# Altium schematic symbol library Minh_Lib.SchLib: 619 symbols (part 2 of 4) (continued)
## EEE-0JA331P
designator EEE?  Supplier Part Number 1: 667-EEE-0JA331P
Aluminum Electrolytic Capacitor, 330UF, 6.3V, 20%, SMD, Full Reel; Manufacturer: Panasonic; Manufacturer Part Number: EEE-0JA331P; Ripple Current (AC): 300mA; Leakage Current: 3uA; Life (Hours): 2000Hour; Dissipation Factor: 0.35%; Supplier 1: Mouser; RoHS: Yes; Category: Aluminum Electrolytic Capacitors; Stock 1: 38; Pricing 1: 1=0.51000, 10=0.30000, 50=0.30000, 100=0.23900, 500=0.17300, 1000=0.16900, 10000=0.16900 (USD); Mount: Surface Mount,PCB; Case/Package: Radial; Contact Plating: Tin; Min Operating Temperature: -40°C; Max Operating Temperature: 85°C; Capacitance: 330uF; Tolerance: 20%; Voltage Rating: 6.3V; Packaging: Tape and Reel; Ripple Current: 300mA; Package Quantity: 1; Voltage Rating (DC): 6.3V; Termination: SMD/SMT; Series: S; Construction: Cylindrical; Diameter: 8mm; Length: 6.2mm; Height: 6.2mm; Height - Seated (Max): 0.244inch; Radiation Hardening: No; REACH SVHC: Unknown; Lead Free: Lead Free; RoHS Compliant: Yes; ComponentLink1URL: https://datasheet.ciiva.com/2985/aba0000ce2-2985028.pdf?src-supplier=Avnet; ComponentLink1Description: https://datasheet.ciiva.com/2985/aba0000ce2-2985028.pdf?src-supplier=Avnet; ComponentLink2URL: https://datasheet.ciiva.com/14604/70255710-14604103.pdf?src-supplier=Allied+Electronics; ComponentLink2Description: https://datasheet.ciiva.com/14604/70255710-14604103.pdf?src-supplier=Allied+Electronics; ComponentLink3URL: https://datasheet.ciiva.com/17534/aba0000ce2-17534825.pdf?src-supplier=Avnet+Europe; ComponentLink3Description: https://datasheet.ciiva.com/17534/aba0000ce2-17534825.pdf?src-supplier=Avnet+Europe; ComponentLink4URL: https://datasheet.ciiva.com/14597/70255710-14597545.pdf?src-supplier=Allied+Electronics; ComponentLink4Description: https://datasheet.ciiva.com/14597/70255710-14597545.pdf?src-supplier=Allied+Electronics
footprint CAPACITOR/ALU - SIZE E/SMD - 8X6.2 (CAPACITOR  -  ALUMINIUM - SIZE E / EEEFK - SMD)
pins: 1, 2
text: +

## EEE-0JA331XP
designator EEE?  Supplier Part Number 1: PCE3861CT-ND
Aluminum Electrolytic Capacitor, 330UF, 6.3V, 20%, SMD, Full Reel; Manufacturer: Panasonic; Manufacturer Part Number: EEE-0JA331XP; Dielectric Material: Aluminium; Ripple Current: 188mA; Life (Hours): 2000Hour; Polarity: Polar; Leakage Current: 20.7uA; Supplier 1: Digi-Key; RoHS: Yes; Category: Aluminum Electrolytic Capacitors; Pricing 1: 1=0.52000, 10=0.36100, 50=0.25240, 100=0.21630 (USD); Mount: Surface Mount,PCB; Case/Package: Radial; Contact Plating: Tin; Min Operating Temperature: -40°C; Max Operating Temperature: 85°C; Capacitance: 330uF; Tolerance: 20%; Voltage Rating: 6.3V; Packaging: Tape and Reel; Ripple Current (AC): 188mA; Package Quantity: 900; Voltage Rating (DC): 6.3V; Termination: SMD/SMT; Voltage: 6.3V; Series: S; Construction: Cylindrical; Diameter: 6.3mm; Length: 8mm; Height: 7.7mm; Height - Seated (Max): 0.303inch; Radiation Hardening: No; REACH SVHC: No SVHC; Lead Free: Lead Free; RoHS Compliant: Yes; ComponentLink1URL: https://datasheet.ciiva.com/24069/aba0000ce2-40801-24069401.pdf?src-supplier=Mouser; ComponentLink1Description: https://datasheet.ciiva.com/24069/aba0000ce2-40801-24069401.pdf?src-supplier=Mouser; ComponentLink2URL: https://datasheet.ciiva.com/14594/70255710-14594604.pdf?src-supplier=Allied+Electronics; ComponentLink2Description: https://datasheet.ciiva.com/14594/70255710-14594604.pdf?src-supplier=Allied+Electronics; ComponentLink3URL: https://datasheet.ciiva.com/14606/70255710-14606556.pdf?src-supplier=Allied+Electronics; ComponentLink3Description: https://datasheet.ciiva.com/14606/70255710-14606556.pdf?src-supplier=Allied+Electronics; ComponentLink4URL: https://datasheet.ciiva.com/2985/aba0000ce2-2985030.pdf?src-supplier=Avnet; ComponentLink4Description: https://datasheet.ciiva.com/2985/aba0000ce2-2985030.pdf?src-supplier=Avnet; ComponentLink5URL: https://datasheet.ciiva.com/16432/aba0000ce2-16432903.pdf?src-supplier=Future+Electronics; ComponentLink5Description: https://datasheet.ciiva.com/16432/aba0000ce2-16432903.pdf?src-supplier=Future+Electronics; ComponentLink6URL: https://datasheet.ciiva.com/17530/aba0000ce2-17530282.pdf?src-supplier=Avnet+Europe; ComponentLink6Description: https://datasheet.ciiva.com/17530/aba0000ce2-17530282.pdf?src-supplier=Avnet+Europe; ComponentLink7URL: https://datasheet.ciiva.com/43470/aba0000ce2-43470616.pdf?src-supplier=Farnell; ComponentLink7Description: https://datasheet.ciiva.com/43470/aba0000ce2-43470616.pdf?src-supplier=Farnell; ComponentLink8URL: https://datasheet.ciiva.com/46378/aba0000ce2-46378271.pdf?src-supplier=Element14; ComponentLink8Description: https://datasheet.ciiva.com/46378/aba0000ce2-46378271.pdf?src-supplier=Element14
footprint CAPACITOR/ALU - SIZE D8/SMD - 6.3X7.7 (CAPACITOR  -  ALUMINIUM - SIZE D8 / EEEFK - SMD)
pins: 1, 2
text: +

## EEE-0JA470SR
designator EEE?  Supplier Part Number 1: 5369821
Aluminum Electrolytic Capacitor, 47UF, 6.3V, 20%, SMD, Full Reel; Manufacturer: Panasonic; Manufacturer Part Number: EEE-0JA470SR; Dielectric Material: Aluminium; Ripple Current: 46mA; Life (Hours): 2000Hour; Leakage Current: 3uA; Lead Length: 2.2mm; Supplier 1: RSComponents; RoHS: Yes; Category: Aluminum Electrolytic Capacitors; Stock 1: 20; Pricing 1: 5=0.32700, 50=0.22700, 250=0.15200, 500=0.11100, 2500=0.07800, 5=0.23600, 50=0.16400, 250=0.11000, 500=0.08000, 2500=0.05600 (USD); Mount: Surface Mount,PCB; Case/Package: Radial; Number of Pins: 2; Contact Plating: Tin; Min Operating Temperature: -40°C; Max Operating Temperature: 85°C; Package Quantity: 1; Capacitance: 47uF; Voltage Rating: 6.3V; Tolerance: 20%; Packaging: Tape and Reel; Voltage Rating (DC): 6.3V; Ripple Current (AC): 46mA; Termination: SMD/SMT; Voltage: 6.3V; Series: S; Construction: Cylindrical; Diameter: 5mm; Length: 5.5mm; Width: 5.3mm; Height: 5.4mm; Height - Seated (Max): 0.213inch; Lead Pitch: 1.5mm; Radiation Hardening: No; REACH SVHC: No SVHC; Lead Free: Lead Free; RoHS Compliant: Yes; ComponentLink1URL: https://datasheet.ciiva.com/11779/0900766b8078636e-11779101.pdf?src-supplier=RSComponents; ComponentLink1Description: https://datasheet.ciiva.com/11779/0900766b8078636e-11779101.pdf?src-supplier=RSComponents; ComponentLink2URL: https://datasheet.ciiva.com/24068/aba0000ce2-40801-24068758.pdf?src-supplier=Mouser; ComponentLink2Description: https://datasheet.ciiva.com/24068/aba0000ce2-40801-24068758.pdf?src-supplier=Mouser; ComponentLink3URL: https://datasheet.ciiva.com/46376/aba0000ce2-46376373.pdf?src-supplier=Element14; ComponentLink3Description: https://datasheet.ciiva.com/46376/aba0000ce2-46376373.pdf?src-supplier=Element14; ComponentLink4URL: https://datasheet.ciiva.com/10330/aba0000ce2-10330998.pdf?src-supplier=Avnet; ComponentLink4Description: https://datasheet.ciiva.com/10330/aba0000ce2-10330998.pdf?src-supplier=Avnet; ComponentLink5URL: https://datasheet.ciiva.com/3773/41677440s8296008n1386-3773962.pdf?src-supplier=Arrow+Electronics; ComponentLink5Description: https://datasheet.ciiva.com/3773/41677440s8296008n1386-3773962.pdf?src-supplier=Arrow+Electronics; ComponentLink6URL: https://datasheet.ciiva.com/16432/aba0000ce2-16432904.pdf?src-supplier=Future+Electronics; ComponentLink6Description: https://datasheet.ciiva.com/16432/aba0000ce2-16432904.pdf?src-supplier=Future+Electronics; ComponentLink7URL: https://datasheet.ciiva.com/17536/aba0000ce2-17536425.pdf?src-supplier=Avnet+Europe; ComponentLink7Description: https://datasheet.ciiva.com/17536/aba0000ce2-17536425.pdf?src-supplier=Avnet+Europe; ComponentLink8URL: https://datasheet.ciiva.com/16539/aba0000ce2-16539931.pdf?src-supplier=Avnet+Asia; ComponentLink8Description: https://datasheet.ciiva.com/16539/aba0000ce2-16539931.pdf?src-supplier=Avnet+Asia
footprint CAPACITOR/ALU - SIZE C/SMD - 5X5.4 (CAPACITOR  -  ALUMINIUM - SIZE C / EEEFK - SMD)
pins: 1, 2
text: +

## EEE-0JA470WR
designator EEE?  Supplier Part Number 1: 53W3743
Cap Aluminum 47uF 6.3V 20% (4 X 5.4mm) SMD 36mA 1000 hr 85°C T/R; Manufacturer: Panasonic; Manufacturer Part Number: EEE-0JA470WR; Life (Hours): 1000Hour; Polarity: Polar; Supplier 1: Newark; RoHS: Yes; Category: Aluminum Electrolytic Capacitors; Stock 1: 14; Pricing 1: 1=0.39400, 10=0.27100, 25=0.23300, 50=0.19500, 100=0.15800, 250=0.13600, 500=0.11400, 1000=0.10000 (USD); Mount: Surface Mount,PCB; Case/Package: Radial; Contact Plating: Tin; Min Operating Temperature: -40°C; Max Operating Temperature: 85°C; Packaging: Tape and Reel; Capacitance: 47uF; Tolerance: 20%; Ripple Current: 36mA; Voltage Rating: 6.3V; Voltage Rating (DC): 6.3V; Package Quantity: 2000; Termination: SMD/SMT; Ripple Current (AC): 36mA; Series: S; Construction: Cylindrical; Diameter: 4mm; Length: 5.5mm; Height: 5.4mm; Height - Seated (Max): 0.213inch; Radiation Hardening: No; Lead Free: Lead Free; RoHS Compliant: Yes; REACH SVHC: No SVHC; ComponentLink1URL: https://datasheet.ciiva.com/2983/aba0000ce2-2983904.pdf?src-supplier=Avnet; ComponentLink1Description: https://datasheet.ciiva.com/2983/aba0000ce2-2983904.pdf?src-supplier=Avnet; ComponentLink2URL: https://datasheet.ciiva.com/43470/aba0000ce2-43470618.pdf?src-supplier=Farnell; ComponentLink2Description: https://datasheet.ciiva.com/43470/aba0000ce2-43470618.pdf?src-supplier=Farnell; ComponentLink3URL: https://datasheet.ciiva.com/46378/aba0000ce2-46378269.pdf?src-supplier=Element14; ComponentLink3Description: https://datasheet.ciiva.com/46378/aba0000ce2-46378269.pdf?src-supplier=Element14; ComponentLink4URL: https://datasheet.ciiva.com/14596/70255710-14596586.pdf?src-supplier=Allied+Electronics; ComponentLink4Description: https://datasheet.ciiva.com/14596/70255710-14596586.pdf?src-supplier=Allied+Electronics; ComponentLink5URL: https://datasheet.ciiva.com/2983/aba0000ce2-2983903.pdf?src-supplier=Avnet; ComponentLink5Description: https://datasheet.ciiva.com/2983/aba0000ce2-2983903.pdf?src-supplier=Avnet; ComponentLink6URL: https://datasheet.ciiva.com/30135/11aba0000ce2-30135741.pdf?src-supplier=Onlinecomponents.com; ComponentLink6Description: https://datasheet.ciiva.com/30135/11aba0000ce2-30135741.pdf?src-supplier=Onlinecomponents.com; ComponentLink7URL: https://datasheet.ciiva.com/17536/aba0000ce2-17536584.pdf?src-supplier=Avnet+Europe; ComponentLink7Description: https://datasheet.ciiva.com/17536/aba0000ce2-17536584.pdf?src-supplier=Avnet+Europe
footprint CAPACITOR/ALU - SIZE B/SMD - 4X5.4 (CAPACITOR  -  ALUMINIUM - SIZE B / EEEFK - SMD)
pins: 1, 2
text: +

## EEE-0JA471P
designator EEE?  Supplier Part Number 1: PCE3864CT-ND
Cap Aluminum 470uF 6.3V 20% (8 X 10.2mm) SMD 380mA 2000h 85 T/R; Manufacturer: Panasonic; Manufacturer Part Number: EEE-0JA471P; Life (Hours): 2000Hour; Leakage Current: 3uA; Lead Diameter: 0.9mm; Supplier 1: Digi-Key; RoHS: Yes; Category: Aluminum Electrolytic Capacitors; Stock 1: 150; Pricing 1: 1=0.65000, 10=0.46000, 50=0.34760, 100=0.30270 (USD); Mount: Surface Mount,PCB; Case/Package: Radial; Contact Plating: Tin; Min Operating Temperature: -40°C; Max Operating Temperature: 85°C; Capacitance: 470uF; Tolerance: 20%; Voltage Rating: 6.3V; Packaging: Tape and Reel; Ripple Current (AC): 380mA; Voltage Rating (DC): 6.3V; Ripple Current: 380mA; Package Quantity: 500; Termination: SMD/SMT; Voltage: 6.3V; Features: General Purpose; Series: S; Construction: Cylindrical; Diameter: 8mm; Length: 10.5mm; Height: 10.2mm; Height - Seated (Max): 0.402inch; Lead Pitch: 3.1mm; Radiation Hardening: No; REACH SVHC: No SVHC; Lead Free: Lead Free; RoHS Compliant: Yes; ComponentLink1URL: https://datasheet.ciiva.com/14601/70255710-14601078.pdf?src-supplier=Allied+Electronics; ComponentLink1Description: https://datasheet.ciiva.com/14601/70255710-14601078.pdf?src-supplier=Allied+Electronics; ComponentLink2URL: https://datasheet.ciiva.com/16212/aba0000ce2-16212214.pdf?src-supplier=Future+Electronics; ComponentLink2Description: https://datasheet.ciiva.com/16212/aba0000ce2-16212214.pdf?src-supplier=Future+Electronics; ComponentLink3URL: https://datasheet.ciiva.com/2985/aba0000ce2-2985033.pdf?src-supplier=Avnet; ComponentLink3Description: https://datasheet.ciiva.com/2985/aba0000ce2-2985033.pdf?src-supplier=Avnet; ComponentLink4URL: https://datasheet.ciiva.com/43470/aba0000ce2-43470619.pdf?src-supplier=Farnell; ComponentLink4Description: https://datasheet.ciiva.com/43470/aba0000ce2-43470619.pdf?src-supplier=Farnell; ComponentLink5URL: https://datasheet.ciiva.com/46378/aba0000ce2-46378268.pdf?src-supplier=Element14; ComponentLink5Description: https://datasheet.ciiva.com/46378/aba0000ce2-46378268.pdf?src-supplier=Element14; ComponentLink6URL: https://datasheet.ciiva.com/17534/aba0000ce2-17534502.pdf?src-supplier=Avnet+Europe; ComponentLink6Description: https://datasheet.ciiva.com/17534/aba0000ce2-17534502.pdf?src-supplier=Avnet+Europe; ComponentLink7URL: https://datasheet.ciiva.com/46374/aba0000ce2-46374351.pdf?src-supplier=Element14; ComponentLink7Description: https://datasheet.ciiva.com/46374/aba0000ce2-46374351.pdf?src-supplier=Element14
footprint CAPACITOR/ALU - SIZE F/SMD - 8X10.2 (CAPACITOR  -  ALUMINIUM - SIZE F / EEEFK - SMD)
pins: 1, 2
text: +

## EEE-1AA101SP
designator EEE?  Supplier Part Number 1: PCE3866DKR-ND
Cap Aluminum 100uF 10V 20% (6.3 X 5.4mm) SMD 70mA 2000 hr 85°C T/R; Manufacturer: Panasonic; Manufacturer Part Number: EEE-1AA101SP; Polarity: Polar; Life (Hours): 2000Hour; Leakage Current: 3uA; Supplier 1: Digi-Key; RoHS: Yes; Category: Aluminum Electrolytic Capacitors; Pricing 1: 1=0.38000, 10=0.26400, 50=0.18520, 100=0.15870, 500=0.11902 (USD); Mount: Surface Mount,PCB; Case/Package: Radial; Contact Plating: Tin; Min Operating Temperature: -40°C; Max Operating Temperature: 85°C; Packaging: Tape and Reel; Capacitance: 100uF; Tolerance: 20%; Ripple Current: 70mA; Voltage Rating: 10V; Package Quantity: 1000; Voltage Rating (DC): 10V; Termination: SMD/SMT; Ripple Current (AC): 70mA; Voltage: 10V; Features: General Purpose; Series: S; Construction: Cylindrical; Diameter: 6.3mm; Length: 5.5mm; Height: 5.4mm; Height - Seated (Max): 0.213inch; Radiation Hardening: No; Lead Free: Lead Free; RoHS Compliant: Yes; REACH SVHC: Unknown; ComponentLink1URL: https://datasheet.ciiva.com/43470/aba0000ce2-43470621.pdf?src-supplier=Farnell; ComponentLink1Description: https://datasheet.ciiva.com/43470/aba0000ce2-43470621.pdf?src-supplier=Farnell; ComponentLink2URL: https://datasheet.ciiva.com/46378/aba0000ce2-46378266.pdf?src-supplier=Element14; ComponentLink2Description: https://datasheet.ciiva.com/46378/aba0000ce2-46378266.pdf?src-supplier=Element14; ComponentLink3URL: https://datasheet.ciiva.com/31414/aba0000ce2-31414629.pdf?src-supplier=Farnell; ComponentLink3Description: https://datasheet.ciiva.com/31414/aba0000ce2-31414629.pdf?src-supplier=Farnell; ComponentLink4URL: https://datasheet.ciiva.com/46374/aba0000ce2-46374349.pdf?src-supplier=Element14; ComponentLink4Description: https://datasheet.ciiva.com/46374/aba0000ce2-46374349.pdf?src-supplier=Element14; ComponentLink5URL: https://datasheet.ciiva.com/14598/70255710-14598444.pdf?src-supplier=Allied+Electronics; ComponentLink5Description: https://datasheet.ciiva.com/14598/70255710-14598444.pdf?src-supplier=Allied+Electronics; ComponentLink6URL: https://datasheet.ciiva.com/14604/70255710-14604862.pdf?src-supplier=Allied+Electronics; ComponentLink6Description: https://datasheet.ciiva.com/14604/70255710-14604862.pdf?src-supplier=Allied+Electronics; ComponentLink7URL: https://datasheet.ciiva.com/2983/aba0000ce2-2983905.pdf?src-supplier=Avnet; ComponentLink7Description: https://datasheet.ciiva.com/2983/aba0000ce2-2983905.pdf?src-supplier=Avnet; ComponentLink8URL: https://datasheet.ciiva.com/15166/getdatasheetpartid-178534-15166250.pdf?src-supplier=Verical; ComponentLink8Description: https://datasheet.ciiva.com/15166/getdatasheetpartid-178534-15166250.pdf?src-supplier=Verical; ComponentLink9URL: https://datasheet.ciiva.com/2985/aba0000ce2-2985040.pdf?src-supplier=Avnet; ComponentLink9Description: https://datasheet.ciiva.com/2985/aba0000ce2-2985040.pdf?src-supplier=Avnet; ComponentLink10URL: https://datasheet.ciiva.com/30099/11aba0000ce2-30099766.pdf?src-supplier=Onlinecomponents.com; ComponentLink10Description: https://datasheet.ciiva.com/30099/11aba0000ce2-30099766.pdf?src-supplier=Onlinecomponents.com; ComponentLink11URL: https://datasheet.ciiva.com/17536/aba0000ce2-17536070.pdf?src-supplier=Avnet+Europe; ComponentLink11Description: https://datasheet.ciiva.com/17536/aba0000ce2-17536070.pdf?src-supplier=Avnet+Europe
footprint CAPACITOR/ALU - SIZE D/SMD - 6.3X5.4 (CAPACITOR  -  ALUMINIUM - SIZE D / EEEFK - SMD)
pins: 1, 2
text: +

## EEE-1AA101WR
designator EEE?  Supplier Part Number 1: 1763738
Cap Aluminum 100uF 10V 20% (5 X 5.4mm) SMD 50mA 1000 hr 85°C T/R; Manufacturer: Panasonic; Manufacturer Part Number: EEE-1AA101WR; Life (Hours): 1000Hour; Supplier 1: RSComponents; RoHS: Yes; Category: Aluminum Electrolytic Capacitors; Stock 1: 1; Pricing 1: 1000=0.08000, 3000=0.07600 (USD); Mount: Surface Mount,PCB; Case/Package: Radial; Contact Plating: Tin; Min Operating Temperature: -40°C; Max Operating Temperature: 85°C; Capacitance: 100uF; Voltage Rating: 10V; Tolerance: 20%; Ripple Current: 50mA; Packaging: Tape and Reel; Package Quantity: 1; Voltage Rating (DC): 10V; Termination: SMD/SMT; Ripple Current (AC): 50mA; Series: S; Construction: Cylindrical; Diameter: 5mm; Length: 5.5mm; Height: 5.4mm; Height - Seated (Max): 0.213inch; Radiation Hardening: No; Lead Free: Lead Free; RoHS Compliant: Yes; REACH SVHC: Unknown; ComponentLink1URL: https://datasheet.ciiva.com/26945/getdatasheetpartid-169213-26945071.pdf?src-supplier=Verical; ComponentLink1Description: https://datasheet.ciiva.com/26945/getdatasheetpartid-169213-26945071.pdf?src-supplier=Verical; ComponentLink2URL: https://datasheet.ciiva.com/24027/aba0000ce2-40801-24027541.pdf?src-supplier=Mouser; ComponentLink2Description: https://datasheet.ciiva.com/24027/aba0000ce2-40801-24027541.pdf?src-supplier=Mouser; ComponentLink3URL: https://datasheet.ciiva.com/14598/70255710-14598233.pdf?src-supplier=Allied+Electronics; ComponentLink3Description: https://datasheet.ciiva.com/14598/70255710-14598233.pdf?src-supplier=Allied+Electronics; ComponentLink4URL: https://datasheet.ciiva.com/14605/70255710-14605689.pdf?src-supplier=Allied+Electronics; ComponentLink4Description: https://datasheet.ciiva.com/14605/70255710-14605689.pdf?src-supplier=Allied+Electronics; ComponentLink5URL: https://datasheet.ciiva.com/11673/aba0000ce2-11673882.pdf?src-supplier=Avnet; ComponentLink5Description: https://datasheet.ciiva.com/11673/aba0000ce2-11673882.pdf?src-supplier=Avnet; ComponentLink6URL: https://datasheet.ciiva.com/16427/aba0000ce2-16427544.pdf?src-supplier=Future+Electronics; ComponentLink6Description: https://datasheet.ciiva.com/16427/aba0000ce2-16427544.pdf?src-supplier=Future+Electronics; ComponentLink7URL: https://datasheet.ciiva.com/2983/aba0000ce2-2983906.pdf?src-supplier=Avnet; ComponentLink7Description: https://datasheet.ciiva.com/2983/aba0000ce2-2983906.pdf?src-supplier=Avnet; ComponentLink8URL: https://datasheet.ciiva.com/30075/11aba0000ce2-30075303.pdf?src-supplier=Onlinecomponents.com; ComponentLink8Description: https://datasheet.ciiva.com/30075/11aba0000ce2-30075303.pdf?src-supplier=Onlinecomponents.com
footprint CAPACITOR/ALU - SIZE C/SMD - 5X5.4 (CAPACITOR  -  ALUMINIUM - SIZE C / EEEFK - SMD)
pins: 1, 2
text: +

## EEE-1AA102P
designator EEE?  Supplier Part Number 1: PCE3868CT-ND
Cap Aluminum Lytic 1000uF 10V 20% (10 X 10.2mm) SMD 580mA 2000h 85C Automotive T/R; Manufacturer: Panasonic; Manufacturer Part Number: EEE-1AA102P; Capacitance: 1mF; Life (Hours): 2000Hour; Leakage Current: 3uA; Supplier 1: Digi-Key; RoHS: Yes; Category: Aluminum Electrolytic Capacitors; Pricing 1: 1=0.76000, 10=0.53800, 50=0.40720, 100=0.35460 (USD); Mount: Surface Mount,PCB; Case/Package: Radial; Contact Plating: Tin; Min Operating Temperature: -40°C; Max Operating Temperature: 85°C; Tolerance: 20%; Ripple Current: 580mA; Packaging: Tape and Reel; Voltage Rating: 10V; Ripple Current (AC): 580mA; Voltage Rating (DC): 10V; Package Quantity: 1; Termination: SMD/SMT; Voltage: 10V; Series: S; Construction: Cylindrical; Diameter: 10mm; Length: 10.5mm; Height: 10.2mm; Height - Seated (Max): 0.402inch; Radiation Hardening: No; REACH SVHC: Unknown; Lead Free: Lead Free; RoHS Compliant: Yes; ComponentLink1URL: https://datasheet.ciiva.com/24235/aba0000ce2-40801-24235638.pdf?src-supplier=Mouser; ComponentLink1Description: https://datasheet.ciiva.com/24235/aba0000ce2-40801-24235638.pdf?src-supplier=Mouser; ComponentLink2URL: https://datasheet.ciiva.com/14604/70255710-14604123.pdf?src-supplier=Allied+Electronics; ComponentLink2Description: https://datasheet.ciiva.com/14604/70255710-14604123.pdf?src-supplier=Allied+Electronics; ComponentLink3URL: https://datasheet.ciiva.com/14601/70255710-14601019.pdf?src-supplier=Allied+Electronics; ComponentLink3Description: https://datasheet.ciiva.com/14601/70255710-14601019.pdf?src-supplier=Allied+Electronics; ComponentLink4URL: https://datasheet.ciiva.com/2983/aba0000ce2-2983907.pdf?src-supplier=Avnet; ComponentLink4Description: https://datasheet.ciiva.com/2983/aba0000ce2-2983907.pdf?src-supplier=Avnet; ComponentLink5URL: https://datasheet.ciiva.com/2985/aba0000ce2-2985042.pdf?src-supplier=Avnet; ComponentLink5Description: https://datasheet.ciiva.com/2985/aba0000ce2-2985042.pdf?src-supplier=Avnet; ComponentLink6URL: https://datasheet.ciiva.com/30085/11aba0000ce2-30085448.pdf?src-supplier=Onlinecomponents.com; ComponentLink6Description: https://datasheet.ciiva.com/30085/11aba0000ce2-30085448.pdf?src-supplier=Onlinecomponents.com; ComponentLink7URL: https://datasheet.ciiva.com/17534/aba0000ce2-17534139.pdf?src-supplier=Avnet+Europe; ComponentLink7Description: https://datasheet.ciiva.com/17534/aba0000ce2-17534139.pdf?src-supplier=Avnet+Europe
footprint CAPACITOR/ALU - SIZE G/SMD - 10X10.2 (CAPACITOR  -  ALUMINIUM - SIZE G / EEEFK - SMD)
pins: 1, 2
text: +

## EEE-1AA220WR
designator EEE?  Supplier Part Number 1: PCE3869DKR-ND
Cap Aluminum 22uF 10V 20% (4 X 5.4mm) SMD 28mA 1000 hr 85°C T/R; Manufacturer: Panasonic; Manufacturer Part Number: EEE-1AA220WR; Polarity: Polar; Life (Hours): 1000Hour; Leakage Current: 3uA; Supplier 1: Digi-Key; RoHS: Yes; Category: Aluminum Electrolytic Capacitors; Pricing 1: 1=0.33000, 10=0.22600, 50=0.15080, 100=0.12820, 500=0.09052, 1000=0.07921 (USD); Mount: Surface Mount,PCB; Case/Package: Radial; Min Operating Temperature: -40°C; Max Operating Temperature: 85°C; Capacitance: 22uF; Packaging: Tape and Reel; Package Quantity: 2000; Tolerance: 20%; Voltage Rating: 10V; Voltage Rating (DC): 10V; Ripple Current: 28mA; Ripple Current (AC): 28mA; Termination: SMD/SMT; Voltage: 10V; Series: S; Construction: Cylindrical; Diameter: 4mm; Length: 5.5mm; Height: 5.4mm; Height - Seated (Max): 0.213inch; Radiation Hardening: No; REACH SVHC: No SVHC; Lead Free: Lead Free; RoHS Compliant: Yes; ComponentLink1URL: https://datasheet.ciiva.com/14602/70255710-14602633.pdf?src-supplier=Allied+Electronics; ComponentLink1Description: https://datasheet.ciiva.com/14602/70255710-14602633.pdf?src-supplier=Allied+Electronics; ComponentLink2URL: https://datasheet.ciiva.com/14609/70255710-14609977.pdf?src-supplier=Allied+Electronics; ComponentLink2Description: https://datasheet.ciiva.com/14609/70255710-14609977.pdf?src-supplier=Allied+Electronics; ComponentLink3URL: https://datasheet.ciiva.com/2985/aba0000ce2-2985044.pdf?src-supplier=Avnet; ComponentLink3Description: https://datasheet.ciiva.com/2985/aba0000ce2-2985044.pdf?src-supplier=Avnet; ComponentLink4URL: https://datasheet.ciiva.com/16223/aba0000ce2-16223701.pdf?src-supplier=Future+Electronics; ComponentLink4Description: https://datasheet.ciiva.com/16223/aba0000ce2-16223701.pdf?src-supplier=Future+Electronics; ComponentLink5URL: https://datasheet.ciiva.com/30093/11aba0000ce2-30093772.pdf?src-supplier=Onlinecomponents.com; ComponentLink5Description: https://datasheet.ciiva.com/30093/11aba0000ce2-30093772.pdf?src-supplier=Onlinecomponents.com; ComponentLink6URL: https://datasheet.ciiva.com/17536/aba0000ce2-17536747.pdf?src-supplier=Avnet+Europe; ComponentLink6Description: https://datasheet.ciiva.com/17536/aba0000ce2-17536747.pdf?src-supplier=Avnet+Europe
footprint CAPACITOR/ALU - SIZE B/SMD - 4X5.4 (CAPACITOR  -  ALUMINIUM - SIZE B / EEEFK - SMD)
pins: 1, 2
text: +

## EEE-1AA221P
designator EEE?  Supplier Part Number 1: PCE3870DKR-ND
Cap Aluminum 220uF 10V 20% (8 X 6.2mm) SMD 250mA 2000h 85°C T/R; Manufacturer: Panasonic; Manufacturer Part Number: EEE-1AA221P; Life (Hours): 2000Hour; Supplier 1: Digi-Key; RoHS: Yes; Category: Aluminum Electrolytic Capacitors; Pricing 1: 1=0.50000, 10=0.35500, 50=0.26800, 100=0.23350, 500=0.17296 (USD); Mount: Surface Mount,PCB; Case/Package: Radial; Contact Plating: Tin; Min Operating Temperature: -40°C; Max Operating Temperature: 85°C; Capacitance: 220uF; Voltage Rating: 10V; Tolerance: 20%; Ripple Current: 250mA; Packaging: Tape and Reel; Package Quantity: 1; Voltage Rating (DC): 10V; Ripple Current (AC): 250mA; Termination: SMD/SMT; Series: S; Construction: Cylindrical; Diameter: 8mm; Length: 6.5mm; Height: 6.2mm; Height - Seated (Max): 0.244inch; Radiation Hardening: No; REACH SVHC: No SVHC; Lead Free: Lead Free; RoHS Compliant: Yes; ComponentLink1URL: https://datasheet.ciiva.com/24024/aba0000ce2-40801-24024652.pdf?src-supplier=Mouser; ComponentLink1Description: https://datasheet.ciiva.com/24024/aba0000ce2-40801-24024652.pdf?src-supplier=Mouser; ComponentLink2URL: https://datasheet.ciiva.com/14596/70255710-14596937.pdf?src-supplier=Allied+Electronics; ComponentLink2Description: https://datasheet.ciiva.com/14596/70255710-14596937.pdf?src-supplier=Allied+Electronics; ComponentLink3URL: https://datasheet.ciiva.com/14606/70255710-14606762.pdf?src-supplier=Allied+Electronics; ComponentLink3Description: https://datasheet.ciiva.com/14606/70255710-14606762.pdf?src-supplier=Allied+Electronics; ComponentLink4URL: https://datasheet.ciiva.com/2985/aba0000ce2-2985047.pdf?src-supplier=Avnet; ComponentLink4Description: https://datasheet.ciiva.com/2985/aba0000ce2-2985047.pdf?src-supplier=Avnet; ComponentLink5URL: https://datasheet.ciiva.com/16393/aba0000ce2-16393999.pdf?src-supplier=Future+Electronics; ComponentLink5Description: https://datasheet.ciiva.com/16393/aba0000ce2-16393999.pdf?src-supplier=Future+Electronics; ComponentLink6URL: https://datasheet.ciiva.com/30208/11aba0000ce2-30208748.pdf?src-supplier=Onlinecomponents.com; ComponentLink6Description: https://datasheet.ciiva.com/30208/11aba0000ce2-30208748.pdf?src-supplier=Onlinecomponents.com; ComponentLink7URL: https://datasheet.ciiva.com/17535/aba0000ce2-17535261.pdf?src-supplier=Avnet+Europe; ComponentLink7Description: https://datasheet.ciiva.com/17535/aba0000ce2-17535261.pdf?src-supplier=Avnet+Europe; ComponentLink8URL: https://datasheet.ciiva.com/16539/aba0000ce2-16539933.pdf?src-supplier=Avnet+Asia; ComponentLink8Description: https://datasheet.ciiva.com/16539/aba0000ce2-16539933.pdf?src-supplier=Avnet+Asia
footprint CAPACITOR/ALU - SIZE E/SMD - 8X6.2 (CAPACITOR  -  ALUMINIUM - SIZE E / EEEFK - SMD)
pins: 1, 2
text: +

## EEE-1AA221XP
designator EEE?  Supplier Part Number 1: 85Y4978
Cap Aluminum 220uF 10V 20% (6.3 X 7.7mm) SMD 173mA 2000h 85°C T/R; Manufacturer: Panasonic; Manufacturer Part Number: EEE-1AA221XP; Dielectric Material: Aluminium; Polarity: Polar; Life (Hours): 2000Hour; Leakage Current: 22uA; Supplier 1: Newark; RoHS: Yes; Category: Aluminum Electrolytic Capacitors; Stock 1: 227; Pricing 1: 1=0.71500, 10=0.49600, 25=0.43000, 50=0.36500, 100=0.29900 (USD); Mount: Surface Mount,PCB; Case/Package: Radial; Contact Plating: Tin; Min Operating Temperature: -40°C; Max Operating Temperature: 85°C; Capacitance: 220uF; Tolerance: 20%; Voltage Rating (DC): 10V; Voltage Rating: 10V; Ripple Current: 173mA; Packaging: Tape and Reel; Package Quantity: 1; Ripple Current (AC): 173mA; Termination: SMD/SMT; Voltage: 10V; Series: S; Construction: Cylindrical; Diameter: 6.3mm; Length: 8mm; Height: 7.7mm; Height - Seated (Max): 0.303inch; Radiation Hardening: No; REACH SVHC: No SVHC; Lead Free: Lead Free; RoHS Compliant: Yes; ComponentLink1URL: https://datasheet.ciiva.com/46378/aba0000ce2-46378261.pdf?src-supplier=Element14; ComponentLink1Description: https://datasheet.ciiva.com/46378/aba0000ce2-46378261.pdf?src-supplier=Element14; ComponentLink2URL: https://datasheet.ciiva.com/31414/aba0000ce2-31414634.pdf?src-supplier=Farnell; ComponentLink2Description: https://datasheet.ciiva.com/31414/aba0000ce2-31414634.pdf?src-supplier=Farnell; ComponentLink3URL: https://datasheet.ciiva.com/46374/aba0000ce2-46374345.pdf?src-supplier=Element14; ComponentLink3Description: https://datasheet.ciiva.com/46374/aba0000ce2-46374345.pdf?src-supplier=Element14; ComponentLink4URL: https://datasheet.ciiva.com/24026/aba0000ce2-40801-24026120.pdf?src-supplier=Mouser; ComponentLink4Description: https://datasheet.ciiva.com/24026/aba0000ce2-40801-24026120.pdf?src-supplier=Mouser; ComponentLink5URL: https://datasheet.ciiva.com/2985/aba0000ce2-2985050.pdf?src-supplier=Avnet; ComponentLink5Description: https://datasheet.ciiva.com/2985/aba0000ce2-2985050.pdf?src-supplier=Avnet; ComponentLink6URL: https://datasheet.ciiva.com/16396/aba0000ce2-16396565.pdf?src-supplier=Future+Electronics; ComponentLink6Description: https://datasheet.ciiva.com/16396/aba0000ce2-16396565.pdf?src-supplier=Future+Electronics; ComponentLink7URL: https://datasheet.ciiva.com/15166/getdatasheetpartid-178511-15166237.pdf?src-supplier=Verical; ComponentLink7Description: https://datasheet.ciiva.com/15166/getdatasheetpartid-178511-15166237.pdf?src-supplier=Verical; ComponentLink8URL: https://datasheet.ciiva.com/30090/11aba0000ce2-30090421.pdf?src-supplier=Onlinecomponents.com; ComponentLink8Description: https://datasheet.ciiva.com/30090/11aba0000ce2-30090421.pdf?src-supplier=Onlinecomponents.com; ComponentLink9URL: https://datasheet.ciiva.com/17530/aba0000ce2-17530183.pdf?src-supplier=Avnet+Europe; ComponentLink9Description: https://datasheet.ciiva.com/17530/aba0000ce2-17530183.pdf?src-supplier=Avnet+Europe
footprint CAPACITOR/ALU - SIZE D8/SMD - 6.3X7.7 (CAPACITOR  -  ALUMINIUM - SIZE D8 / EEEFK - SMD)
pins: 1, 2
text: +

## EEE-1AA330SR
designator EEE?  Supplier Part Number 1: 62W7326
Cap Aluminum 33uF 10V 20% (5 X 5.4mm) SMD 43mA 2000 hr 85°C T/R; Manufacturer: Panasonic; Manufacturer Part Number: EEE-1AA330SR; Dielectric Material: Aluminium; Life (Hours): 2000Hour; Leakage Current: 3uA; Lead Length: 2.2mm; Supplier 1: Newark; RoHS: Yes; Category: Aluminum Electrolytic Capacitors; Stock 1: 32; Pricing 1: 1=0.42900, 10=0.29700, 25=0.25400, 50=0.21100, 100=0.16800 (USD); Mount: Surface Mount,PCB; Case/Package: Radial; Number of Pins: 2; Contact Plating: Tin; Min Operating Temperature: -40°C; Max Operating Temperature: 85°C; Package Quantity: 1; Capacitance: 33uF; Voltage Rating: 10V; Tolerance: 20%; Ripple Current: 43mA; Packaging: Tape and Reel; Voltage Rating (DC): 10V; Ripple Current (AC): 43mA; Termination: SMD/SMT; Voltage: 10V; Series: S; Construction: Cylindrical; Diameter: 5mm; Length: 5.5mm; Width: 5.3mm; Height: 5.4mm; Height - Seated (Max): 0.213inch; Lead Pitch: 1.5mm; Radiation Hardening: No; REACH SVHC: No SVHC; Lead Free: Lead Free; RoHS Compliant: Yes; ComponentLink1URL: https://datasheet.ciiva.com/11784/0900766b8078636e-11784641.pdf?src-supplier=RSComponents; ComponentLink1Description: https://datasheet.ciiva.com/11784/0900766b8078636e-11784641.pdf?src-supplier=RSComponents; ComponentLink2URL: https://datasheet.ciiva.com/24068/aba0000ce2-40801-24068542.pdf?src-supplier=Mouser; ComponentLink2Description: https://datasheet.ciiva.com/24068/aba0000ce2-40801-24068542.pdf?src-supplier=Mouser; ComponentLink3URL: https://datasheet.ciiva.com/14592/70255710-14592327.pdf?src-supplier=Allied+Electronics; ComponentLink3Description: https://datasheet.ciiva.com/14592/70255710-14592327.pdf?src-supplier=Allied+Electronics; ComponentLink4URL: https://datasheet.ciiva.com/43485/aba0000ce2-43485606.pdf?src-supplier=Farnell; ComponentLink4Description: https://datasheet.ciiva.com/43485/aba0000ce2-43485606.pdf?src-supplier=Farnell; ComponentLink5URL: https://datasheet.ciiva.com/46386/aba0000ce2-46386698.pdf?src-supplier=Element14; ComponentLink5Description: https://datasheet.ciiva.com/46386/aba0000ce2-46386698.pdf?src-supplier=Element14; ComponentLink6URL: https://datasheet.ciiva.com/6012/aba0000ce2-6012717.pdf?src-supplier=Farnell; ComponentLink6Description: https://datasheet.ciiva.com/6012/aba0000ce2-6012717.pdf?src-supplier=Farnell; ComponentLink7URL: https://datasheet.ciiva.com/2985/aba0000ce2-2985053.pdf?src-supplier=Avnet; ComponentLink7Description: https://datasheet.ciiva.com/2985/aba0000ce2-2985053.pdf?src-supplier=Avnet; ComponentLink8URL: https://datasheet.ciiva.com/16432/aba0000ce2-16432905.pdf?src-supplier=Future+Electronics; ComponentLink8Description: https://datasheet.ciiva.com/16432/aba0000ce2-16432905.pdf?src-supplier=Future+Electronics; ComponentLink9URL: https://datasheet.ciiva.com/2985/aba0000ce2-2985054.pdf?src-supplier=Avnet; ComponentLink9Description: https://datasheet.ciiva.com/2985/aba0000ce2-2985054.pdf?src-supplier=Avnet; ComponentLink10URL: https://datasheet.ciiva.com/30247/11aba0000ce2-30247157.pdf?src-supplier=Onlinecomponents.com; ComponentLink10Description: https://datasheet.ciiva.com/30247/11aba0000ce2-30247157.pdf?src-supplier=Onlinecomponents.com; ComponentLink11URL: https://datasheet.ciiva.com/17536/aba0000ce2-17536486.pdf?src-supplier=Avnet+Europe; ComponentLink11Description: https://datasheet.ciiva.com/17536/aba0000ce2-17536486.pdf?src-supplier=Avnet+Europe
footprint CAPACITOR/ALU - SIZE C/SMD - 5X5.4 (CAPACITOR  -  ALUMINIUM - SIZE C / EEEFK - SMD)
pins: 1, 2
text: +

## EEE-1AA330WR
designator EEE?  Supplier Part Number 1: PCE3873CT-ND
Capacitor Aluminum Electrolytic 33uF 10 Volt 20% (4 X 5.4mm) Surface Mount 29mA 1000h 85C; Manufacturer: Panasonic; Manufacturer Part Number: EEE-1AA330WR; Voltage Rating: 10V; Life (Hours): 1000Hour; Leakage Current: 3uA; Dissipation Factor: 0.3%; Supplier 1: Digi-Key; RoHS: Yes; Category: Aluminum Electrolytic Capacitors; Stock 1: 1909; Pricing 1: 1=0.36000, 10=0.25000, 50=0.16660, 100=0.14150, 500=0.09992, 1000=0.08742 (USD); Mount: Surface Mount,PCB; Case/Package: Radial; Min Operating Temperature: -40°C; Max Operating Temperature: 85°C; Capacitance: 33uF; Tolerance: 20%; Ripple Current: 29mA; Packaging: Tape and Reel; Package Quantity: 1; Termination: SMD/SMT; Voltage Rating (DC): 10V; Ripple Current (AC): 29mA; Voltage: 10V; Series: S; Construction: Cylindrical; Diameter: 4mm; Length: 5.4mm; Height: 5.4mm; Height - Seated (Max): 0.213inch; Radiation Hardening: No; REACH SVHC: Unknown; Lead Free: Lead Free; RoHS Compliant: Yes; ComponentLink1URL: https://datasheet.ciiva.com/19458/1355276-19458342.pdf?src-supplier=Jameco; ComponentLink1Description: https://datasheet.ciiva.com/19458/1355276-19458342.pdf?src-supplier=Jameco; ComponentLink2URL: https://datasheet.ciiva.com/46374/aba0000ce2-46374344.pdf?src-supplier=Element14; ComponentLink2Description: https://datasheet.ciiva.com/46374/aba0000ce2-46374344.pdf?src-supplier=Element14; ComponentLink3URL: https://datasheet.ciiva.com/30128/11aba0000ce2-30128569.pdf?src-supplier=Onlinecomponents.com; ComponentLink3Description: https://datasheet.ciiva.com/30128/11aba0000ce2-30128569.pdf?src-supplier=Onlinecomponents.com; ComponentLink4URL: https://datasheet.ciiva.com/31414/aba0000ce2-31414635.pdf?src-supplier=Farnell; ComponentLink4Description: https://datasheet.ciiva.com/31414/aba0000ce2-31414635.pdf?src-supplier=Farnell; ComponentLink5URL: https://datasheet.ciiva.com/24070/aba0000ce2-40801-24070013.pdf?src-supplier=Mouser; ComponentLink5Description: https://datasheet.ciiva.com/24070/aba0000ce2-40801-24070013.pdf?src-supplier=Mouser; ComponentLink6URL: https://datasheet.ciiva.com/26823/getdatasheetpartid-178591-26823335.pdf?src-supplier=Verical; ComponentLink6Description: https://datasheet.ciiva.com/26823/getdatasheetpartid-178591-26823335.pdf?src-supplier=Verical; ComponentLink7URL: https://datasheet.ciiva.com/16397/aba0000ce2-16397067.pdf?src-supplier=Future+Electronics; ComponentLink7Description: https://datasheet.ciiva.com/16397/aba0000ce2-16397067.pdf?src-supplier=Future+Electronics; ComponentLink8URL: https://datasheet.ciiva.com/14592/70255710-14592924.pdf?src-supplier=Allied+Electronics; ComponentLink8Description: https://datasheet.ciiva.com/14592/70255710-14592924.pdf?src-supplier=Allied+Electronics; ComponentLink9URL: https://datasheet.ciiva.com/17536/aba0000ce2-17536717.pdf?src-supplier=Avnet+Europe; ComponentLink9Description: https://datasheet.ciiva.com/17536/aba0000ce2-17536717.pdf?src-supplier=Avnet+Europe; ComponentLink10URL: https://datasheet.ciiva.com/14595/70255710-14595166.pdf?src-supplier=Allied+Electronics; ComponentLink10Description: https://datasheet.ciiva.com/14595/70255710-14595166.pdf?src-supplier=Allied+Electronics
footprint CAPACITOR/ALU - SIZE B/SMD - 4X5.4 (CAPACITOR  -  ALUMINIUM - SIZE B / EEEFK - SMD)
pins: 1, 2
text: +

## EEE-1AA331P
designator EEE?  Supplier Part Number 1: PCE3874CT-ND
Cap Aluminum 330uF 10V 20% (8 X 10.2mm) SMD 390mA 2000h 85°C T/R; Manufacturer: Panasonic; Manufacturer Part Number: EEE-1AA331P; Polarity: Polar; Life (Hours): 2000Hour; Leakage Current: 3uA; Supplier 1: Digi-Key; RoHS: Yes; Category: Aluminum Electrolytic Capacitors; Stock 1: 55; Pricing 1: 1=0.65000, 10=0.46000, 50=0.34760, 100=0.30270 (USD); Mount: Surface Mount,PCB; Case/Package: Radial; Contact Plating: Tin; Min Operating Temperature: -40°C; Max Operating Temperature: 85°C; Packaging: Tape and Reel; Capacitance: 330uF; Tolerance: 20%; Ripple Current: 390mA; Voltage Rating: 10V; Package Quantity: 500; Voltage Rating (DC): 10V; Termination: SMD/SMT; Ripple Current (AC): 390mA; Voltage: 10V; Series: S; Construction: Cylindrical; Diameter: 8mm; Length: 10.5mm; Height: 10.2mm; Height - Seated (Max): 0.402inch; Radiation Hardening: No; Lead Free: Lead Free; RoHS Compliant: Yes; REACH SVHC: Unknown; ComponentLink1URL: https://datasheet.ciiva.com/46374/aba0000ce2-46374343.pdf?src-supplier=Element14; ComponentLink1Description: https://datasheet.ciiva.com/46374/aba0000ce2-46374343.pdf?src-supplier=Element14; ComponentLink2URL: https://datasheet.ciiva.com/14600/70255710-14600488.pdf?src-supplier=Allied+Electronics; ComponentLink2Description: https://datasheet.ciiva.com/14600/70255710-14600488.pdf?src-supplier=Allied+Electronics; ComponentLink3URL: https://datasheet.ciiva.com/14606/70255710-14606521.pdf?src-supplier=Allied+Electronics; ComponentLink3Description: https://datasheet.ciiva.com/14606/70255710-14606521.pdf?src-supplier=Allied+Electronics; ComponentLink4URL: https://datasheet.ciiva.com/16205/aba0000ce2-16205642.pdf?src-supplier=Future+Electronics; ComponentLink4Description: https://datasheet.ciiva.com/16205/aba0000ce2-16205642.pdf?src-supplier=Future+Electronics; ComponentLink5URL: https://datasheet.ciiva.com/31414/aba0000ce2-31414636.pdf?src-supplier=Farnell; ComponentLink5Description: https://datasheet.ciiva.com/31414/aba0000ce2-31414636.pdf?src-supplier=Farnell; ComponentLink6URL: https://datasheet.ciiva.com/2985/aba0000ce2-2985057.pdf?src-supplier=Avnet; ComponentLink6Description: https://datasheet.ciiva.com/2985/aba0000ce2-2985057.pdf?src-supplier=Avnet; ComponentLink7URL: https://datasheet.ciiva.com/24072/aba0000ce2-40801-24072222.pdf?src-supplier=Mouser; ComponentLink7Description: https://datasheet.ciiva.com/24072/aba0000ce2-40801-24072222.pdf?src-supplier=Mouser
footprint CAPACITOR/ALU - SIZE F/SMD - 8X10.2 (CAPACITOR  -  ALUMINIUM - SIZE F / EEEFK - SMD)
pins: 1, 2
text: +

## EEE-1AA471P
designator EEE?  Supplier Part Number 1: PCE3876CT-ND
Cap Aluminum 470uF 10V 20% (10 X 10.2mm) SMD 400mA 2000 hr 85°C T/R; Manufacturer: Panasonic; Manufacturer Part Number: EEE-1AA471P; Life (Hours): 2000Hour; Leakage Current: 3uA; Supplier 1: Digi-Key; RoHS: Yes; Category: Aluminum Electrolytic Capacitors; Pricing 1: 1=0.76000, 10=0.53800, 50=0.40720, 100=0.35460 (USD); Mount: Surface Mount; Case/Package: Radial; Min Operating Temperature: -40°C; Max Operating Temperature: 85°C; Capacitance: 470uF; Tolerance: 20%; Ripple Current: 400mA; Packaging: Tape and Reel; Voltage Rating: 10V; Package Quantity: 1; Voltage Rating (DC): 10V; Ripple Current (AC): 400mA; Termination: SMD/SMT; Voltage: 10V; Series: S; Construction: Cylindrical; Diameter: 10mm; Length: 10.5mm; Height: 10.2mm; Height - Seated (Max): 0.402inch; Radiation Hardening: No; REACH SVHC: Unknown; Lead Free: Lead Free; RoHS Compliant: Yes; ComponentLink1URL: https://datasheet.ciiva.com/24071/aba0000ce2-40801-24071498.pdf?src-supplier=Mouser; ComponentLink1Description: https://datasheet.ciiva.com/24071/aba0000ce2-40801-24071498.pdf?src-supplier=Mouser; ComponentLink2URL: https://datasheet.ciiva.com/17534/aba0000ce2-17534445.pdf?src-supplier=Avnet+Europe; ComponentLink2Description: https://datasheet.ciiva.com/17534/aba0000ce2-17534445.pdf?src-supplier=Avnet+Europe; ComponentLink3URL: https://datasheet.ciiva.com/14596/70255710-14596318.pdf?src-supplier=Allied+Electronics; ComponentLink3Description: https://datasheet.ciiva.com/14596/70255710-14596318.pdf?src-supplier=Allied+Electronics; ComponentLink4URL: https://datasheet.ciiva.com/14598/70255710-14598491.pdf?src-supplier=Allied+Electronics; ComponentLink4Description: https://datasheet.ciiva.com/14598/70255710-14598491.pdf?src-supplier=Allied+Electronics
footprint CAPACITOR/ALU - SIZE G/SMD - 10X10.2 (CAPACITOR  -  ALUMINIUM - SIZE G / EEEFK - SMD)
pins: 1, 2
text: +

## EEE-1AA471UP
designator EEE?  Supplier Part Number 1: EEE-1AA471UP
Cap Aluminum 470uF 10V 20% (8 X 10.2mm) SMD 390mA 2000 hr 85°C T/R; Manufacturer: Panasonic; Life (Hours): 2000Hour; Polarity: Polar; Leakage Current: 3uA; Supplier 1: Arrow Electronics; Manufacturer Part Number: EEE-1AA471UP; RoHS: Yes; Category: Aluminum Electrolytic Capacitors; Stock 1: 1; Pricing 1: 1=0.54340 (USD); Mount: Surface Mount,PCB; Case/Package: Radial; Contact Plating: Tin; Min Operating Temperature: -40°C; Max Operating Temperature: 85°C; Capacitance: 470uF; Voltage Rating: 10V; Tolerance: 20%; Ripple Current: 390mA; Packaging: Tape and Reel; Package Quantity: 1; Voltage Rating (DC): 10V; Termination: SMD/SMT; Voltage: 10V; Ripple Current (AC): 390mA; Series: S; Construction: Cylindrical; Diameter: 8mm; Length: 10.5mm; Height: 10.2mm; Height - Seated (Max): 0.402inch; Radiation Hardening: No; Lead Free: Lead Free; RoHS Compliant: Yes; REACH SVHC: No SVHC; ComponentLink1URL: https://datasheet.ciiva.com/14609/70255710-14609045.pdf?src-supplier=Allied+Electronics; ComponentLink1Description: https://datasheet.ciiva.com/14609/70255710-14609045.pdf?src-supplier=Allied+Electronics; ComponentLink2URL: https://datasheet.ciiva.com/10331/aba0000ce2-10331007.pdf?src-supplier=Avnet; ComponentLink2Description: https://datasheet.ciiva.com/10331/aba0000ce2-10331007.pdf?src-supplier=Avnet; ComponentLink3URL: https://datasheet.ciiva.com/16205/aba0000ce2-16205643.pdf?src-supplier=Future+Electronics; ComponentLink3Description: https://datasheet.ciiva.com/16205/aba0000ce2-16205643.pdf?src-supplier=Future+Electronics; ComponentLink4URL: https://datasheet.ciiva.com/30069/11aba0000ce2-30069113.pdf?src-supplier=Onlinecomponents.com; ComponentLink4Description: https://datasheet.ciiva.com/30069/11aba0000ce2-30069113.pdf?src-supplier=Onlinecomponents.com; ComponentLink5URL: https://datasheet.ciiva.com/17534/aba0000ce2-17534489.pdf?src-supplier=Avnet+Europe; ComponentLink5Description: https://datasheet.ciiva.com/17534/aba0000ce2-17534489.pdf?src-supplier=Avnet+Europe; ComponentLink6URL: https://datasheet.ciiva.com/43470/aba0000ce2-43470630.pdf?src-supplier=Farnell; ComponentLink6Description: https://datasheet.ciiva.com/43470/aba0000ce2-43470630.pdf?src-supplier=Farnell; ComponentLink7URL: https://datasheet.ciiva.com/46378/aba0000ce2-46378319.pdf?src-supplier=Element14; ComponentLink7Description: https://datasheet.ciiva.com/46378/aba0000ce2-46378319.pdf?src-supplier=Element14; ComponentLink8URL: https://datasheet.ciiva.com/31414/aba0000ce2-31414638.pdf?src-supplier=Farnell; ComponentLink8Description: https://datasheet.ciiva.com/31414/aba0000ce2-31414638.pdf?src-supplier=Farnell; ComponentLink9URL: https://datasheet.ciiva.com/46374/aba0000ce2-46374341.pdf?src-supplier=Element14; ComponentLink9Description: https://datasheet.ciiva.com/46374/aba0000ce2-46374341.pdf?src-supplier=Element14
footprint CAPACITOR/ALU - SIZE F/SMD - 8X10.2 (CAPACITOR  -  ALUMINIUM - SIZE F / EEEFK - SMD)
pins: 1, 2
text: +
